# Altium footprint library pcbSMDv1.PcbLib: 60 footprints (part 3 of 4)
Each footprint in its own frame and in the unit in brackets; x right, y up, seen from the top. Pads: shape width x height; smd on the part's side, far side on the other; paste and mask are expansions set on the pad; w line width, h text height; cw(c..) or ccw(c..) is an arc to the next point about the centre after c.
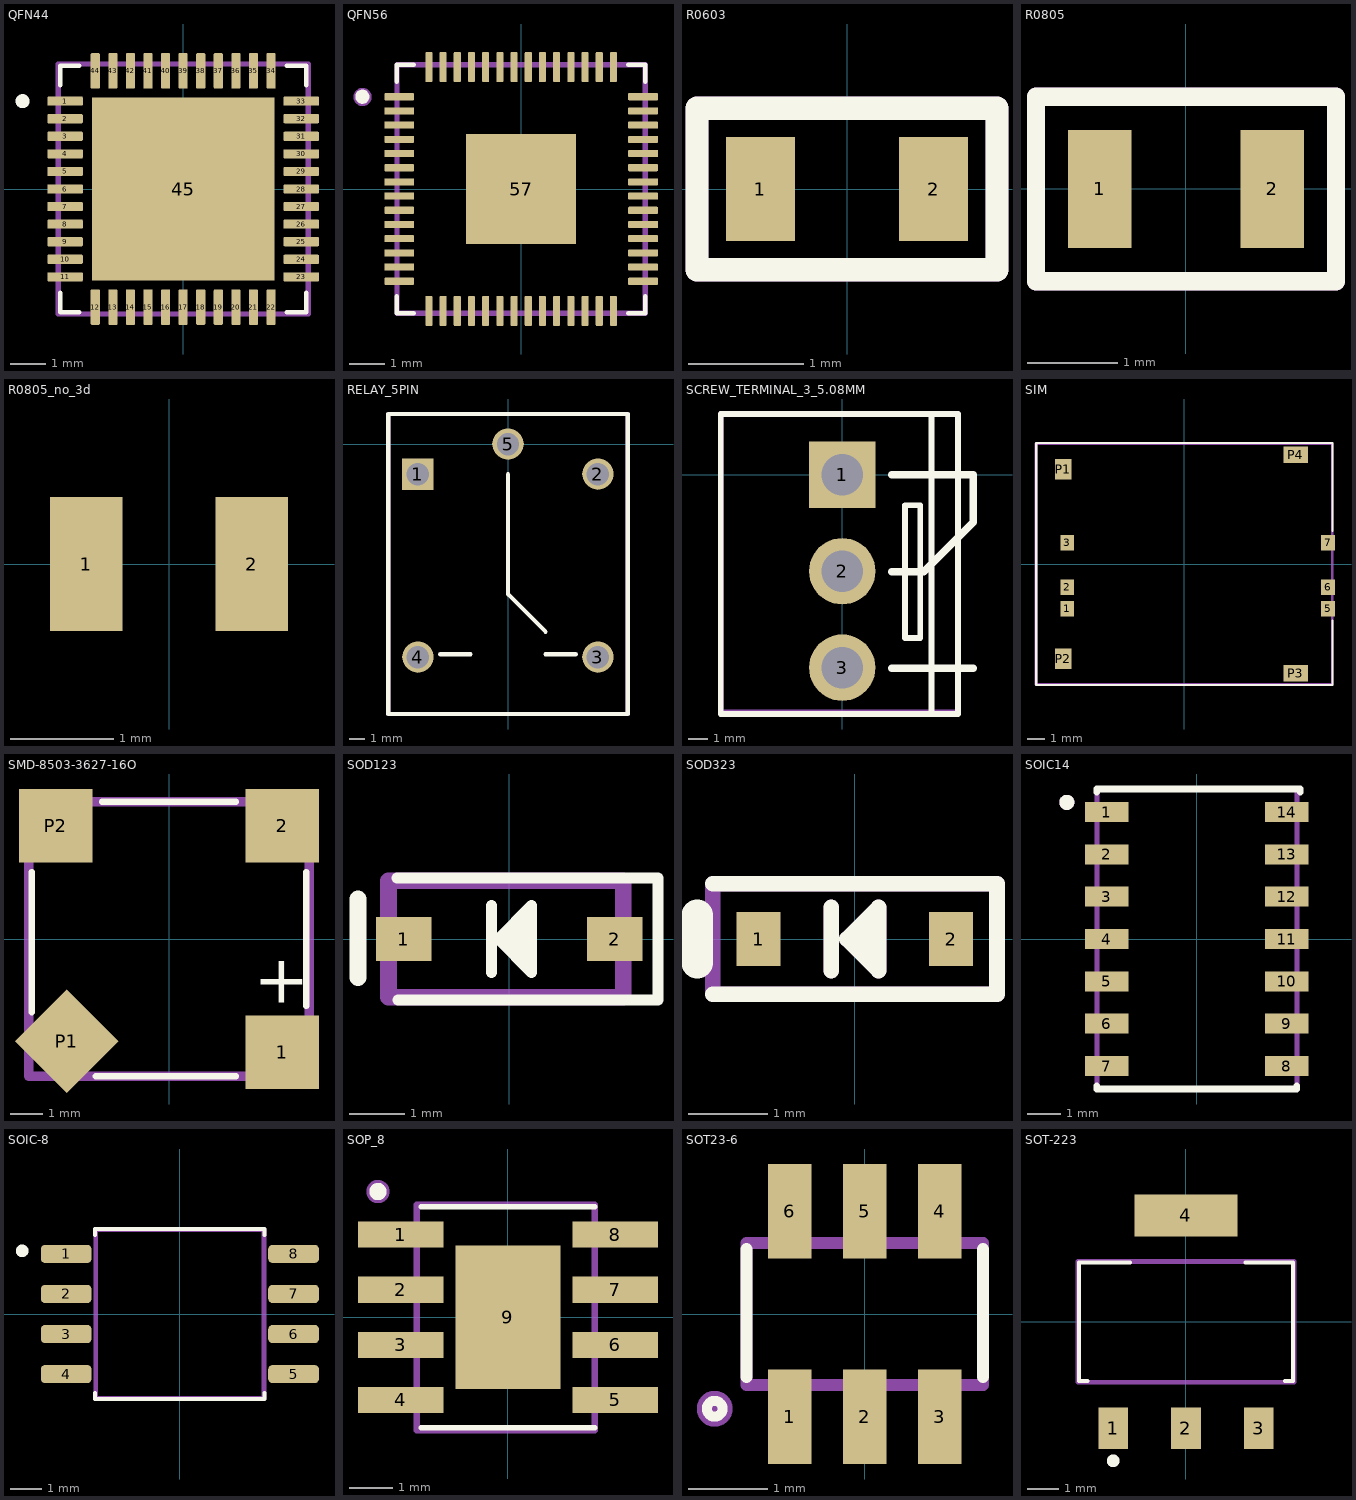
[diagram p2: the footprints below, top view; thin cyan lines are the x and y axes]

## QFN44 [mm]
pads (45):
  rrect25% 1.01x0.26 smd: 1(-3.36,2.5) 2(-3.36,2) 3(-3.36,1.5) 4(-3.36,1) 5(-3.36,0.5) 6(-3.36,0) 7(-3.36,-0.5) 8(-3.36,-1) 9(-3.36,-1.5) 10(-3.36,-2) 11(-3.36,-2.5) 23(3.36,-2.5) 24(3.36,-2) 25(3.36,-1.5) 26(3.36,-1) 27(3.36,-0.5) 28(3.36,0) 29(3.36,0.5) 30(3.36,1) 31(3.36,1.5) 32(3.36,2) 33(3.36,2.5)
  rrect25% 0.26x1.01 smd: 12(-2.5,-3.36) 13(-2,-3.36) 14(-1.5,-3.36) 15(-1,-3.36) 16(-0.5,-3.36) 17(0,-3.36) 18(0.5,-3.36) 19(1,-3.36) 20(1.5,-3.36) 21(2,-3.36) 22(2.5,-3.36) 34(2.5,3.36) 35(2,3.36) 36(1.5,3.36) 37(1,3.36) 38(0.5,3.36) 39(0,3.36) 40(-0.5,3.36) 41(-1,3.36) 42(-1.5,3.36) 43(-2,3.36) 44(-2.5,3.36)
  rect 5.2x5.2 smd paste-4: 45(0,0)
Top Overlay:
  circle w0.2: c-4.57,2.5 r0.1
  lines w0.127: -3.5,-2.95 -3.5,-3.5 -2.95,-3.5 ; -3.5,2.95 -3.5,3.5 -2.95,3.5 ; 2.95,-3.5 3.5,-3.5 3.5,-2.95 ; 2.95,3.5 3.5,3.5 3.5,2.95
Top Paste:
  region: 2.12,-2.12 0.48,-2.12 0.48,-0.48 2.12,-0.48
  region: -0.48,-2.12 -2.12,-2.12 -2.12,-0.48 -0.48,-0.48
  region: 2.12,0.48 0.48,0.48 0.48,2.12 2.12,2.12
  region: -0.48,0.48 -2.12,0.48 -2.12,2.12 -0.48,2.12
Mechanical 24:
  lines w0.15: -3.556,-3.556 3.556,-3.556 3.556,3.556 -3.556,3.556 -3.556,-3.556
  text ".Designator" at -0.889,-0.762 h1.52
3D body "atmega32u4-mu.STEP": height 1, standoff 0, extent -3.5,-3.5 3.5,3.5

## QFN56 [mm]
pads (57):
  rrect25% 0.84x0.2 smd mask+0.09: 1(-3.435,2.6) 2(-3.435,2.2) 3(-3.435,1.8) 4(-3.435,1.4) 5(-3.435,1) 6(-3.435,0.6) 7(-3.435,0.2) 8(-3.435,-0.2) 9(-3.435,-0.6) 10(-3.435,-1) 11(-3.435,-1.4) 12(-3.435,-1.8) 13(-3.435,-2.2) 14(-3.435,-2.6) 29(3.435,-2.6) 30(3.435,-2.2) 31(3.435,-1.8) 32(3.435,-1.4) 33(3.435,-1) 34(3.435,-0.6) 35(3.435,-0.2) 36(3.435,0.2) 37(3.435,0.6) 38(3.435,1) 39(3.435,1.4) 40(3.435,1.8) 41(3.435,2.2) 42(3.435,2.6)
  rrect25% 0.2x0.84 smd mask+0.09: 15(-2.6,-3.435) 16(-2.2,-3.435) 17(-1.8,-3.435) 18(-1.4,-3.435) 19(-1,-3.435) 20(-0.6,-3.435) 21(-0.2,-3.435) 22(0.2,-3.435) 23(0.6,-3.435) 24(1,-3.435) 25(1.4,-3.435) 26(1.8,-3.435) 27(2.2,-3.435) 28(2.6,-3.435) 43(2.6,3.435) 44(2.2,3.435) 45(1.8,3.435) 46(1.4,3.435) 47(1,3.435) 48(0.6,3.435) 49(0.2,3.435) 50(-0.2,3.435) 51(-0.6,3.435) 52(-1,3.435) 53(-1.4,3.435) 54(-1.8,3.435) 55(-2.2,3.435) 56(-2.6,3.435)
  rect 3.1x3.1 smd paste-0.57: 57(0,0)
Top Overlay:
  circle w0.2: c-4.475,2.6 r0.1
  lines w0.127: -3.5,-3.02 -3.5,-3.5 -3.02,-3.5 ; -3.5,3.02 -3.5,3.5 -3.02,3.5 ; 3.02,-3.5 3.5,-3.5 3.5,-3.02 ; 3.02,3.5 3.5,3.5 3.5,3.02
Mechanical 24:
  circle w0.254: c-4.47,2.591 r0.127
  lines w0.15: -3.5,-3.5 3.5,-3.5 3.5,3.5 -3.5,3.5 -3.5,-3.5
  text ".Designator" at -0.762,-0.737 h1.52
3D body "RP2040.STEP": height 0.9, standoff 0, extent -3.5,-3.5 3.5,3.5

## R0603 [mm]
pads (2):
  rect 0.6x0.9 smd: 1(-0.75,0) 2(0.75,0)
Top Overlay:
  lines w0.2: -1.3,-0.7 1.3,-0.7 1.3,0.7 -1.3,0.7 -1.3,-0.7
Mechanical 24:
  lines w0.2: -1.3,-0.7 1.3,-0.7 1.3,0.7 -1.3,0.7 -1.3,-0.7
  text ".Designator" at -0.76,0.973 h1
3D body "R0603.step": height 0.81, standoff 0.01, extent -0.787,-0.42 0.813,0.42

## R0805 [mm]
pads (2):
  rect 0.7x1.3 smd: 1(-0.95,0) 2(0.95,0)
Top Overlay:
  lines w0.2: -1.651,-1.016 1.651,-1.016 1.651,1.016 -1.651,1.016 -1.651,-1.016
Mechanical 24:
  lines w0.2: -1.651,-1.016 1.651,-1.016 1.651,1.016 -1.651,1.016 -1.651,-1.016
  text ".Designator" at -1.092,-0.5 h1.02
3D body "User Library-Chip Resistor2.step": height 0.7, standoff 0, extent -1,-0.6 1,0.6

## R0805_no_3d [mm]
pads (2):
  rect 0.7x1.3 smd: 1(-0.8,0) 2(0.8,0)
Mechanical 24:
  text ".Designator" at -1.092,-0.5 h1.02

## RELAY_5PIN [mm]
pads (5):
  rect 2.1x2.1 hole 1.5: 1(-6,-2)
  round 2.1 hole 1.5: 2(6,-2) 3(6,-14.2) 4(-6,-14.2) 5(0,0)
Top Overlay:
  lines w0.3: -4.5,-14 -2.5,-14 ; 0,-2 0,-9 0,-10 2.5,-12.5 ; 2.5,-14 4.5,-14 ; -8,-18 8,-18 8,2 -8,2 -8,-18
Mechanical 24:
  lines w0.3: -8,-18 8,-18 8,2 -8,2 -8,-18
  text ".Designator" at -0.746,-9.488 h1.52
3D body "g5le-1_5dc.stp": height 19, standoff -3.5, extent -8.225,-19.825 8.275,2.675

## SCREW_TERMINAL_3_5.08MM [mm]
pads (3):
  rect 3.5x3.5 hole 2.2: 1(0,0)
  round 3.5 hole 2.2: 2(0,-5.08) 3(0,-10.16)
Top Overlay:
  lines w0.3: 4.7,-12.5 4.7,3.2 ; -6.4,-12.6 -6.4,3.2 6.093,3.2 6.1,3.193 6.1,-12.6 -6.4,-12.6 ; 3.3,-8.6 3.3,-1.6 4.1,-1.6 4.1,-8.6 3.3,-8.6
  lines w0.4: 2.6,-10.2 6.9,-10.2 ; 2.6,-5.1 4.3,-5.1 6.9,-2.5 6.9,0 2.6,0
Mechanical 24:
  lines w0.3: -6.4,-12.5 6.1,-12.5 6.1,3.2 -6.4,3.2 -6.4,-12.5
  text ".Designator" at -3.133,-9.2 h1
3D body "1546074-3--3DModel-STEP-1.STEP": height 15, standoff -3.8, extent -6.4,-12.57 6.103,3.17

## SIM [mm]
pads (10):
  rect 0.8x0.9 smd: 1(-6.71,-2.57) 2(-6.71,-1.33) 3(-6.71,1.21) 5(8.23,-2.57) 6(8.23,-1.33) 7(8.23,1.21)
  rect 0.95x1.2 smd: P1(-6.94,5.425) P2(-6.94,-5.425)
  rect 1.4x0.95 smd: P3(6.37,-6.26) P4(6.37,6.26)
Top Overlay:
  lines w0.127: 8.48,-3.25 8.48,-6.925 -8.48,-6.925 -8.48,6.925 8.48,6.925 8.48,1.9
Mechanical 24:
  lines w0.15: -8.5,-6.903 8.459,-6.903 8.459,6.9 -8.5,6.9 -8.5,-6.903
  text ".Designator" at -2.446,0.762 h1.52
3D body "78800-0001.stp": height 1.3, standoff -0.21, extent -8.38,-6.925 8.58,6.925

## SMD-8503-3627-16O [mm]
pads (4):
  rect 2.3x2.3 smd: 1(3.55,-3.55) 2(3.55,3.55) P2(-3.55,3.55)
  rect 2.3x2.3 smd rot 45: P1(-3.2,-3.2)
Top Overlay:
  lines w0.2: -4.3,-2.3 -4.3,2.1 ; -2.3,-4.3 2.1,-4.3 ; -2.1,4.3 2.1,4.3 ; 4.3,-2.1 4.3,2.1
  text "+" at 2.654,-2 h1.52
Mechanical 24:
  lines w0.3: -4.4,-4.3 4.4,-4.3 4.4,4.3 -4.4,4.3 -4.4,-4.3
  text ".Designator" at -1.446,-0.338 h1.52
3D body "CMT-8503-87_90.step": height 3.06, standoff 0.01, extent -4.25,-4.25 4.25,4.25

## SOD123 [mm]
pads (2):
  rect 1x0.8 smd: 1(-1.9,0) 2(1.9,0)
Top Overlay:
  lines w0.2: -2.025,1.1 2.675,1.1 2.675,-1.1 -2,-1.1 ; -0.325,-0.6 -0.325,0.6 ; -0.2,0 0.4,0.6 0.4,-0.6 -0.2,0 ; -0.2,0 0.4,0 0.1,0.3 0.2,0.3 ; 0.1,-0.3 0.275,-0.125 0.325,-0.125 0.3,-0.1 0.325,-0.075 0.325,-0.025 0.1,0.2 ; 0.1,-0.3 0.2,-0.3 0.35,-0.3 0.35,-0.25 0.1,0 ; 0.1,-0.3 0.1,0 ; 0.1,0 0.4,0.3 0.2,0.3 ; 0.1,0 0.1,0.2 ; 0.1,0.2 0.2,0.3
  lines w0.3: -2.725,-0.7 -2.725,0.725
Mechanical 24:
  lines w0.3: -2.175,-1.05 2.05,-1.05 2.05,1.05 -2.175,1.05 -2.175,-1.05
  text ".Designator" at -0.321,1.237 h1.52
3D body "User Library-SOD123-1.step": height 1.18, standoff 0, extent -1.975,-0.9 1.925,0.9

## SOD323 [mil]
pads (2):
  rect 22x27 smd: 1(-48,0) 2(48,0)
Top Overlay:
  lines w7.87: -70.87,-27.56 70.87,-27.56 70.87,27.56 -70.87,27.56 ; -11.81,-15.75 -11.81,15.75 ; 3.94,7.87 11.81,0 ; 11.81,0 3.94,-7.87 3.94,0 11.81,0 ; 11.81,0 11.81,15.75 ; 11.81,15.75 -3.94,0 11.81,-15.75 11.81,15.75
  lines w15.75: -78.74,-11.81 -78.74,11.81
Mechanical 24:
  lines w7.87: -11.81,-15.75 -11.81,15.75 ; -70.87,-27.56 70.87,-27.56 70.87,27.56 -70.87,27.56 -70.87,-27.56 ; -3.94,0 11.81,-15.75 11.81,15.75 -3.94,0
  text ".Designator" at -43.31,-65.62 h27.56
3D body "User Library-SOD323.STEP": height 35.43, standoff -3.54, extent -49.21,-24.61 49.21,24.61

## SOIC14 [mm]
pads (14):
  rect 1.3x0.6 smd: 1(-2.7,3.81) 2(-2.7,2.54) 3(-2.7,1.27) 4(-2.7,0) 5(-2.7,-1.27) 6(-2.7,-2.54) 7(-2.7,-3.81) 8(2.7,-3.81) 9(2.7,-2.54) 10(2.7,-1.27) 11(2.7,0) 12(2.7,1.27) 13(2.7,2.54) 14(2.7,3.81)
Top Overlay:
  circle w0.254: c-3.9,4.1 r0.1
  lines w0.2: -3,-4.4 -3,-4.5 -2.987,-4.487 ; -3,4.4 -3,4.5 2.7,4.5 3.1,4.5 3.1,4.4 ; -2.974,-4.5 2.2,-4.5 3,-4.5 3,-4.4
Mechanical 24:
  circle w0.254: c-3.9,4.1 r0.1
  lines w0.15: -3,-4.5 3,-4.5 3,4.5 -3,4.5 -3,-4.5
  text ".Designator" at -0.846,-0.938 h1.52
3D body "User Library-SOIC14-150.step": height 1.75, standoff 0, extent -2.9,-4.275 2.9,4.275

## SOIC-8 [mm]
pads (8):
  rrect50% 1.61x0.58 smd: 1(-3.605,1.905) 2(-3.605,0.635) 3(-3.605,-0.635) 4(-3.605,-1.905) 5(3.605,-1.905) 6(3.605,-0.635) 7(3.605,0.635) 8(3.605,1.905)
Top Overlay:
  circle w0.2: c-5,2 r0.1
  lines w0.127: -2.69,-2.51 -2.69,-2.69 2.69,-2.69 2.69,-2.51 ; -2.69,2.51 -2.69,2.69 2.69,2.69 2.69,2.51
Mechanical 24:
  lines w0.15: -2.667,-2.667 2.667,-2.667 2.667,2.667 -2.667,2.667 -2.667,-2.667
  text ".Designator" at -0.889,-0.635 h1.52
3D body "SOIC8.STEP": height 2.3, standoff -0.02, extent -4.196,-2.69 4.196,2.69

## SOP_8 [mm]
pads (9):
  rect 1.97x0.6 smd mask+0.06: 1(-2.475,1.905) 2(-2.475,0.635) 3(-2.475,-0.635) 4(-2.475,-1.905) 5(2.475,-1.905) 6(2.475,-0.635) 7(2.475,0.635) 8(2.475,1.905)
  rect 2.413x3.302 smd paste-3 mask+0.06: 9(0,0)
Top Overlay:
  circle w0.2: c-3,2.9 r0.1
  lines w0.127: -2,-2.55 2,-2.55 ; -2,2.55 2,2.55
Top Paste:
  region: 0.645,-0.82 -0.645,-0.82 -0.645,0.82 0.645,0.82
Mechanical 24:
  circle w0.254: c-3,2.9 r0.141
  lines w0.15: -2.1,-2.6 2,-2.6 2,2.6 -2.1,2.6 -2.1,-2.6
  text ".Designator" at -1.1,-0.533 h1.1
3D body "SOP-8.STEP": height 1.87, standoff 0, extent -3.11,-2.5 3.11,2.5

## SOT23-6 [mm]
pads (6):
  rect 0.55x1.2 smd: 1(-0.95,-1.3) 2(0,-1.3) 3(0.95,-1.3) 4(0.95,1.3) 5(0,1.3) 6(-0.95,1.3)
Top Overlay:
  circle w0.127: c-1.9,-1.2 r0.1
  lines w0.152: -1.5,-0.8 -1.5,0.82 ; 1.5,-0.8 1.5,0.82
Mechanical 24:
  circle w0.254: c-1.9,-1.2 r0.1
  lines w0.15: -1.5,-0.9 1.5,-0.9 1.5,0.9 -1.5,0.9 -1.5,-0.9
  text ".Designator" at -1.15,-0.483 h1.1
3D body "DW01A--3DModel-STEP-56544.STEP": height 1.45, standoff 0, extent -1.45,-1.4 1.45,1.4

## SOT-223 [mm]
pads (4):
  rect 0.93x1.31 smd: 1(-2.29,-3.345) 2(0,-3.345) 3(2.29,-3.345)
  rect 3.24x1.31 smd: 4(0,3.345)
Top Overlay:
  circle w0.2: c-2.29,-4.373 r0.1
  lines w0.127: -3.1,-1.86 -3.36,-1.86 -3.36,1.86 -1.76,1.86 ; 1.87,1.86 3.36,1.86 3.36,-1.86 3.11,-1.86
Mechanical 24:
  lines w0.15: -3.4,-1.9 3.4,-1.9 3.4,1.9 -3.4,1.9 -3.4,-1.9
  text ".Designator" at -1.046,-0.638 h1.52
3D body "AMS1117-3.3--3DModel-STEP-56544.STEP": height 1.77, standoff -0.04, extent -3.251,-3.399 3.251,3.599